# Altium footprint library PcbLib1.PcbLib: 150 footprints (part 6 of 10)
Each footprint in its own frame and in the unit in brackets; x right, y up, seen from the top. Pads: shape width x height; smd on the part's side, far side on the other; paste and mask are expansions set on the pad; w line width, h text height; cw(c..) or ccw(c..) is an arc to the next point about the centre after c.
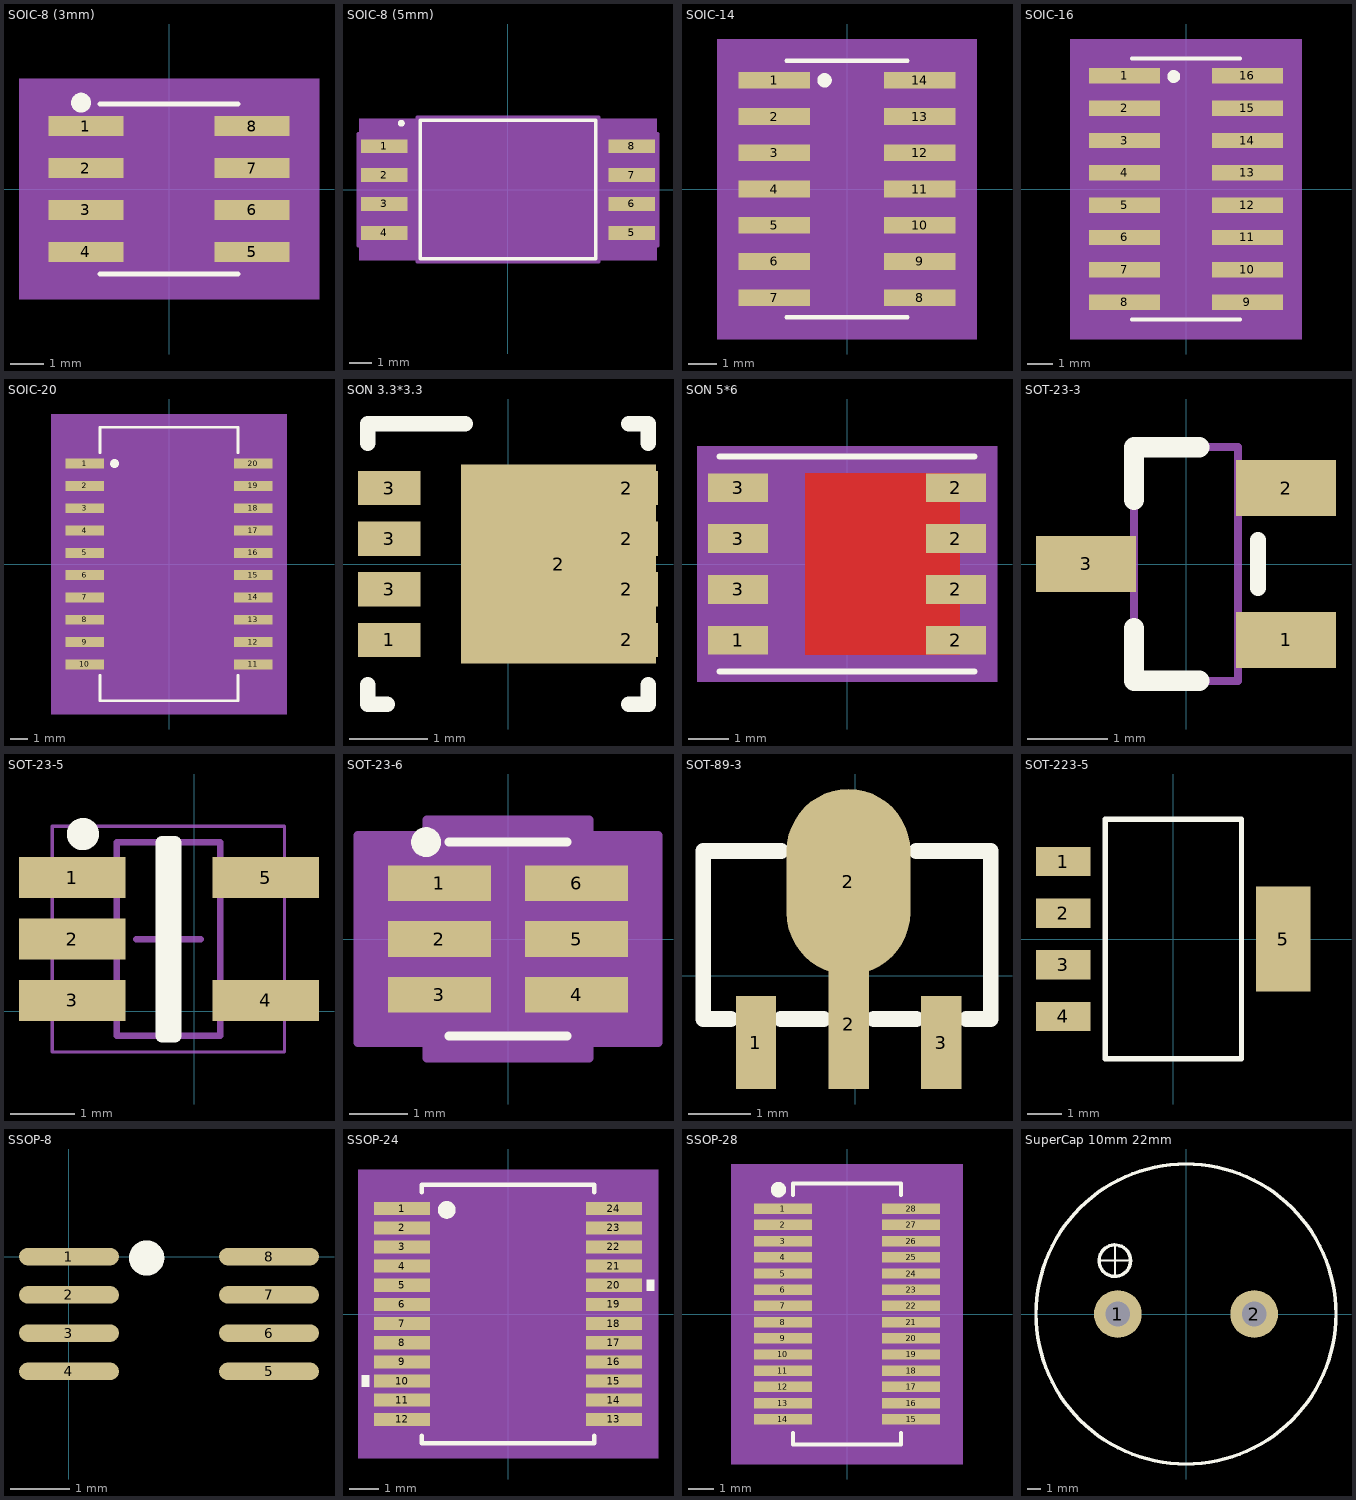
[diagram p5: the footprints below, top view; thin cyan lines are the x and y axes]

## SOIC-8 (3mm) [mm]
pads (8):
  rect 2.27x0.608 smd paste+0 mask+0: 1(-2.514,1.905) 2(-2.514,0.635) 3(-2.514,-0.635) 4(-2.514,-1.905) 5(2.514,-1.905) 6(2.514,-0.635) 7(2.514,0.635) 8(2.514,1.905)
Top Overlay:
  lines w0.152: -2.083,-2.578 2.083,-2.578 ; -2.083,2.578 2.083,2.578
  lines w0.3: -2.663,2.764 ccw(c-2.661,2.614) -2.66,2.764
Mechanical 5:
  region: 4.538,-3.34 -4.538,-3.34 -4.538,3.34 4.538,3.34
Mechanical 13:
  lines w0: -0.305,2.451 ccw(c0,2.451) 0.305,2.451
  lines w0.025: -3.099,-2.159 -3.099,-1.651 -1.956,-1.651 -1.956,-2.159 -3.099,-2.159 ; -3.099,-0.889 -3.099,-0.381 -1.956,-0.381 -1.956,-0.889 -3.099,-0.889 ; -3.099,0.381 -3.099,0.889 -1.956,0.889 -1.956,0.381 -3.099,0.381 ; -3.099,1.651 -3.099,2.159 -1.956,2.159 -1.956,1.651 -3.099,1.651 ; -1.956,-2.451 1.956,-2.451 1.956,2.451 -1.956,2.451 -1.956,-2.451 ; 1.956,-2.159 1.956,-1.651 3.099,-1.651 3.099,-2.159 1.956,-2.159 ; 1.956,-0.889 1.956,-0.381 3.099,-0.381 3.099,-0.889 1.956,-0.889 ; 1.956,0.381 1.956,0.889 3.099,0.889 3.099,0.381 1.956,0.381 ; 1.956,1.651 1.956,2.159 3.099,2.159 3.099,1.651 1.956,1.651
  text "*" at -1.892,1.105 h1.27
Mechanical 15:
  region: -2.464,-2.717 -4.157,-2.717 -4.157,2.717 -2.464,2.717 -2.464,2.959 2.464,2.959 2.464,2.717 4.157,2.717 4.157,-2.717 2.464,-2.717 2.464,-2.959 -2.464,-2.959
  lines w0.152: -4.157,-2.717 -4.157,2.717 -2.464,2.717 -2.464,2.959 2.464,2.959 2.464,2.717 4.157,2.717 4.157,-2.717 2.464,-2.717 2.464,-2.959 -2.464,-2.959 -2.464,-2.717 -4.157,-2.717
3D body: height 0.25, standoff 0, extent 0,0 0.254,0.254
3D body "D0008B_N-L.step": height 1.76, standoff 0, extent -3.099,-2.451 3.099,2.451

## SOIC-8 (5mm) [mil]
pads (8):
  rect 80x24 smd paste+0 mask+3: 1(-214.57,75) 2(-214.57,25) 3(-214.57,-25) 4(-214.57,-75) 5(214.57,-75) 6(214.57,-25) 7(214.57,25) 8(214.57,75)
Top Overlay:
  circle w6: c-185,115 r3
  lines w6: -152.5,-120 152.5,-120 152.5,120 -152.5,120 -152.5,-120
Mechanical 5:
  region: 257.57,-122.5 -257.57,-122.5 -257.57,122.5 257.57,122.5
Mechanical 13:
  circle w0: c-137.5,75 r3
  lines w0: -12,115 ccw(c0,115) 12,115
  lines w1: -147.5,-115 147.5,-115 147.5,115 -147.5,115 -147.5,-115
Mechanical 15:
  region: -157.5,-97 -260.07,-97 -260.07,97 -157.5,97 -157.5,125 157.5,125 157.5,97 260.07,97 260.07,-97 157.5,-97 157.5,-125 -157.5,-125
  lines w6: -260.07,-97 -260.07,97 -157.5,97 -157.5,125 157.5,125 157.5,97 260.07,97 260.07,-97 157.5,-97 157.5,-125 -157.5,-125 -157.5,-97 -260.07,-97
3D body: height 10, standoff 0, extent 0,0 10,10
3D body "DWV_8.step": height 110.12, standoff 0, extent -236.29,-115 236.3,115

## SOIC-14 [mil]
pads (14):
  rect 98.43x23 smd paste+0 mask+0: 1(-100.5,150) 2(-100.5,100) 3(-100.5,50) 4(-100.5,0) 5(-100.5,-50) 6(-100.5,-100) 7(-100.5,-150) 8(100.5,-150) 9(100.5,-100) 10(100.5,-50) 11(100.5,0) 12(100.5,50) 13(100.5,100) 14(100.5,150)
Top Overlay:
  circle w10: c-31,150 r5
  lines w6: -83.5,-177 83.5,-177 ; -83.5,177 83.5,177
Mechanical 5:
  region: 179,-207 -179,-207 -179,207 179,207
Mechanical 13:
  lines w0: -12,172 ccw(c0,172) 12,172
  lines w1: -122,-159.5 -78.5,-159.5 -78.5,-140.5 -122,-140.5 -122,-159.5 ; -122,-109.5 -78.5,-109.5 -78.5,-90.5 -122,-90.5 -122,-109.5 ; -122,-59.5 -78.5,-59.5 -78.5,-40.5 -122,-40.5 -122,-59.5 ; -122,-9.5 -78.5,-9.5 -78.5,9.5 -122,9.5 -122,-9.5 ; -122,40.5 -78.5,40.5 -78.5,59.5 -122,59.5 -122,40.5 ; -122,90.5 -78.5,90.5 -78.5,109.5 -122,109.5 -122,90.5 ; -122,140.5 -78.5,140.5 -78.5,159.5 -122,159.5 -122,140.5 ; -78.5,-172 -78.5,172 78.5,172 78.5,-172 -78.5,-172 ; 78.5,-159.5 122,-159.5 122,-140.5 78.5,-140.5 78.5,-159.5 ; 78.5,-109.5 122,-109.5 122,-90.5 78.5,-90.5 78.5,-109.5 ; 78.5,-59.5 122,-59.5 122,-40.5 78.5,-40.5 78.5,-59.5 ; 78.5,-9.5 122,-9.5 122,9.5 78.5,9.5 78.5,-9.5 ; 78.5,40.5 122,40.5 122,59.5 78.5,59.5 78.5,40.5 ; 78.5,90.5 122,90.5 122,109.5 78.5,109.5 78.5,90.5 ; 78.5,140.5 122,140.5 122,159.5 78.5,159.5 78.5,140.5
  text "*" at -76,119 h50
Mechanical 15:
  region: -98.5,-181.5 -164,-181.5 -164,181.5 -98.5,181.5 -98.5,192 98.5,192 98.5,181.5 164,181.5 164,-181.5 98.5,-181.5 98.5,-192 -98.5,-192
  lines w6: -164,-181.5 -98.5,-181.5 -98.5,-192 98.5,-192 98.5,-181.5 164,-181.5 164,181.5 98.5,181.5 98.5,192 -98.5,192 -98.5,181.5 -164,181.5 -164,-181.5
3D body: height 10, standoff 0, extent 0,0 10,10
3D body "SOT108-1-L.step": height 69.09, standoff 0, extent -126.01,-172.01 118.01,172

## SOIC-16 [mm]
pads (16):
  rect 2.8x0.608 smd paste+0 mask+0: 1(-2.412,4.445) 2(-2.412,3.175) 3(-2.412,1.905) 4(-2.412,0.635) 5(-2.412,-0.635) 6(-2.412,-1.905) 7(-2.412,-3.175) 8(-2.412,-4.445) 9(2.412,-4.445) 10(2.412,-3.175) 11(2.412,-1.905) 12(2.412,-0.635) 13(2.412,0.635) 14(2.412,1.905) 15(2.412,3.175) 16(2.412,4.445)
Top Overlay:
  circle w0.254: c-0.483,4.42 r0.127
  lines w0.152: -2.121,-5.131 2.121,-5.131 ; -2.121,5.131 2.121,5.131
Mechanical 5:
  region: 4.538,-5.893 -4.538,-5.893 -4.538,5.893 4.538,5.893
Mechanical 13:
  lines w0: -0.305,5.004 ccw(c0,5.004) 0.305,5.004
  lines w0.025: -3.099,-4.699 -1.994,-4.699 -1.994,-4.191 -3.099,-4.191 -3.099,-4.699 ; -3.099,-3.429 -1.994,-3.429 -1.994,-2.921 -3.099,-2.921 -3.099,-3.429 ; -3.099,-2.159 -1.994,-2.159 -1.994,-1.651 -3.099,-1.651 -3.099,-2.159 ; -3.099,-0.889 -1.994,-0.889 -1.994,-0.381 -3.099,-0.381 -3.099,-0.889 ; -3.099,0.381 -1.994,0.381 -1.994,0.889 -3.099,0.889 -3.099,0.381 ; -3.099,1.651 -1.994,1.651 -1.994,2.159 -3.099,2.159 -3.099,1.651 ; -3.099,2.921 -1.994,2.921 -1.994,3.429 -3.099,3.429 -3.099,2.921 ; -3.099,4.191 -1.994,4.191 -1.994,4.699 -3.099,4.699 -3.099,4.191 ; -1.994,-5.004 -1.994,5.004 1.994,5.004 1.994,-5.004 -1.994,-5.004 ; 1.994,-4.699 3.099,-4.699 3.099,-4.191 1.994,-4.191 1.994,-4.699 ; 1.994,-3.429 3.099,-3.429 3.099,-2.921 1.994,-2.921 1.994,-3.429 ; 1.994,-2.159 3.099,-2.159 3.099,-1.651 1.994,-1.651 1.994,-2.159 ; 1.994,-0.889 3.099,-0.889 3.099,-0.381 1.994,-0.381 1.994,-0.889 ; 1.994,0.381 3.099,0.381 3.099,0.889 1.994,0.889 1.994,0.381 ; 1.994,1.651 3.099,1.651 3.099,2.159 1.994,2.159 1.994,1.651 ; 1.994,2.921 3.099,2.921 3.099,3.429 1.994,3.429 1.994,2.921 ; 1.994,4.191 3.099,4.191 3.099,4.699 1.994,4.699 1.994,4.191
  text "*" at -1.93,3.658 h1.27
Mechanical 15:
  region: -2.502,-5.257 -4.157,-5.257 -4.157,5.257 -2.502,5.257 -2.502,5.512 2.502,5.512 2.502,5.257 4.157,5.257 4.157,-5.257 2.502,-5.257 2.502,-5.512 -2.502,-5.512
  lines w0.152: -4.157,-5.257 -2.502,-5.257 -2.502,-5.512 2.502,-5.512 2.502,-5.257 4.157,-5.257 4.157,5.257 2.502,5.257 2.502,5.512 -2.502,5.512 -2.502,5.257 -4.157,5.257 -4.157,-5.257
3D body: height 0.25, standoff 0, extent 0,0 0.254,0.254
3D body "D16-M.step": height 1.76, standoff 0, extent -3.099,-5.004 3.099,5.004

## SOIC-20 [mm]
pads (20):
  rect 2.2x0.56 smd paste+0 mask+0: 1(-4.8,5.715) 2(-4.8,4.445) 3(-4.8,3.175) 4(-4.8,1.905) 5(-4.8,0.635) 6(-4.8,-0.635) 7(-4.8,-1.905) 8(-4.8,-3.175) 9(-4.8,-4.445) 10(-4.8,-5.715) 11(4.8,-5.715) 12(4.8,-4.445) 13(4.8,-3.175) 14(4.8,-1.905) 15(4.8,-0.635) 16(4.8,0.635) 17(4.8,1.905) 18(4.8,3.175) 19(4.8,4.445) 20(4.8,5.715)
Top Overlay:
  circle w0.254: c-3.099,5.715 r0.127
  lines w0.152: -3.927,-6.328 -3.927,-7.777 3.927,-7.777 3.927,-6.328 ; -3.927,6.328 -3.927,7.777 3.927,7.777 3.927,6.328
Mechanical 5:
  region: 6.694,-8.539 -6.694,-8.539 -6.694,8.539 6.694,8.539
Mechanical 13:
  lines w0: -0.305,7.65 ccw(c0,7.65) 0.305,7.65
  lines w0.025: -5.255,-5.945 -3.8,-5.945 -3.8,-5.485 -5.255,-5.485 -5.255,-5.945 ; -5.255,-4.675 -3.8,-4.675 -3.8,-4.215 -5.255,-4.215 -5.255,-4.675 ; -5.255,-3.405 -3.8,-3.405 -3.8,-2.945 -5.255,-2.945 -5.255,-3.405 ; -5.255,-2.135 -3.8,-2.135 -3.8,-1.675 -5.255,-1.675 -5.255,-2.135 ; -5.255,-0.865 -3.8,-0.865 -3.8,-0.405 -5.255,-0.405 -5.255,-0.865 ; -5.255,0.405 -3.8,0.405 -3.8,0.865 -5.255,0.865 -5.255,0.405 ; -5.255,1.675 -3.8,1.675 -3.8,2.135 -5.255,2.135 -5.255,1.675 ; -5.255,2.945 -3.8,2.945 -3.8,3.405 -5.255,3.405 -5.255,2.945 ; -5.255,4.215 -3.8,4.215 -3.8,4.675 -5.255,4.675 -5.255,4.215 ; -5.255,5.485 -3.8,5.485 -3.8,5.945 -5.255,5.945 -5.255,5.485 ; -3.8,-7.65 -3.8,7.65 3.8,7.65 3.8,-7.65 -3.8,-7.65 ; 3.8,-5.945 5.255,-5.945 5.255,-5.485 3.8,-5.485 3.8,-5.945 ; 3.8,-4.675 5.255,-4.675 5.255,-4.215 3.8,-4.215 3.8,-4.675 ; 3.8,-3.405 5.255,-3.405 5.255,-2.945 3.8,-2.945 3.8,-3.405 ; 3.8,-2.135 5.255,-2.135 5.255,-1.675 3.8,-1.675 3.8,-2.135 ; 3.8,-0.865 5.255,-0.865 5.255,-0.405 3.8,-0.405 3.8,-0.865 ; 3.8,0.405 5.255,0.405 5.255,0.865 3.8,0.865 3.8,0.405 ; 3.8,1.675 5.255,1.675 5.255,2.135 3.8,2.135 3.8,1.675 ; 3.8,2.945 5.255,2.945 5.255,3.405 3.8,3.405 3.8,2.945 ; 3.8,4.215 5.255,4.215 5.255,4.675 3.8,4.675 3.8,4.215 ; 3.8,5.485 5.255,5.485 5.255,5.945 3.8,5.945 3.8,5.485
  text "*" at -3.737,6.304 h1.27
Mechanical 15:
  region: -4.308,-6.503 -6.313,-6.503 -6.313,6.503 -4.308,6.503 -4.308,8.158 4.308,8.158 4.308,6.503 6.313,6.503 6.313,-6.503 4.308,-6.503 4.308,-8.158 -4.308,-8.158
  lines w0.152: -6.313,-6.503 -4.308,-6.503 -4.308,-8.158 4.308,-8.158 4.308,-6.503 6.313,-6.503 6.313,6.503 4.308,6.503 4.308,8.158 -4.308,8.158 -4.308,6.503 -6.313,6.503 -6.313,-6.503
3D body: height 0.25, standoff 0, extent 0,0 0.254,0.254
3D body "RI_20_1-M.step": height 2.64, standoff 0, extent -5.255,-7.65 5.255,7.65

## SON 3.3*3.3 [mm]
pads (9):
  rect 0.8x0.44 smd paste-0.05 mask-0.051: 1(-1.525,-0.975) 2(1.525,-0.975) 2(1.525,-0.325) 2(1.525,0.325) 2(1.525,0.975) 3(-1.525,-0.325) 3(-1.525,0.325) 3(-1.525,0.975)
  rect 2.5x2.55 smd paste-1.262 mask-1.257: 2(0.65,0)
Top Overlay:
  lines w0.2: -1.8,-1.55 -1.8,-1.8 -1.55,-1.8 ; -1.8,1.55 -1.8,1.8 -0.55,1.8 ; 1.55,-1.8 1.8,-1.8 1.8,-1.55 ; 1.55,1.8 1.8,1.8 1.8,1.55
Top Paste:
  region: 0.327,0.141 0.326,0.151 0.326,1.174 0.327,1.184 0.33,1.194 0.335,1.202 0.341,1.21 0.349,1.216 0.357,1.221 0.367,1.224 0.377,1.225 0.951,1.225 0.961,1.224 0.971,1.221 0.979,1.216 0.987,1.21 0.993,1.202 0.998,1.194 1.001,1.184 1.002,1.174 1.002,0.151 1.001,0.141 0.998,0.131 0.993,0.123 0.987,0.115 0.979,0.109 0.971,0.104 0.961,0.101 0.951,0.1 0.377,0.1 0.367,0.101 0.357,0.104 0.349,0.109 0.341,0.115 0.335,0.123 0.33,0.131
  region: 0.327,-1.184 0.326,-1.174 0.326,-0.151 0.327,-0.141 0.33,-0.131 0.335,-0.123 0.341,-0.115 0.349,-0.109 0.357,-0.104 0.367,-0.101 0.377,-0.1 0.951,-0.1 0.961,-0.101 0.971,-0.104 0.979,-0.109 0.987,-0.115 0.993,-0.123 0.998,-0.131 1.001,-0.141 1.002,-0.151 1.002,-1.174 1.001,-1.184 0.998,-1.194 0.993,-1.202 0.987,-1.21 0.979,-1.216 0.971,-1.221 0.961,-1.224 0.951,-1.225 0.377,-1.225 0.367,-1.224 0.357,-1.221 0.349,-1.216 0.341,-1.21 0.335,-1.202 0.33,-1.194
  region: 0.125,-0.141 0.126,-0.151 0.126,-1.174 0.125,-1.184 0.122,-1.194 0.117,-1.202 0.111,-1.21 0.103,-1.216 0.095,-1.221 0.085,-1.224 0.075,-1.225 -0.499,-1.225 -0.509,-1.224 -0.519,-1.221 -0.527,-1.216 -0.535,-1.21 -0.541,-1.202 -0.546,-1.194 -0.549,-1.184 -0.55,-1.174 -0.55,-0.151 -0.549,-0.141 -0.546,-0.131 -0.541,-0.123 -0.535,-0.115 -0.527,-0.109 -0.519,-0.104 -0.509,-0.101 -0.499,-0.1 0.075,-0.1 0.085,-0.101 0.095,-0.104 0.103,-0.109 0.111,-0.115 0.117,-0.123 0.122,-0.131
  region: 0.125,1.184 0.126,1.174 0.126,0.151 0.125,0.141 0.122,0.131 0.117,0.123 0.111,0.115 0.103,0.109 0.095,0.104 0.085,0.101 0.075,0.1 -0.499,0.1 -0.509,0.101 -0.519,0.104 -0.527,0.109 -0.535,0.115 -0.541,0.123 -0.546,0.131 -0.549,0.141 -0.55,0.151 -0.55,1.174 -0.549,1.184 -0.546,1.194 -0.541,1.202 -0.535,1.21 -0.527,1.216 -0.519,1.221 -0.509,1.224 -0.499,1.225 0.075,1.225 0.085,1.224 0.095,1.221 0.103,1.216 0.111,1.21 0.117,1.202 0.122,1.194
Top Solder:
  drawing of 5 lines, arcs and shapes, not listed
3D body "DQG0008A.stp": height 1.1, standoff 0, extent -1.523,-1.65 1.777,1.65
3D body: height 0.25, standoff 0, extent 0,0 0.254,0.254

## SON 5*6 [mm]
pads (8):
  rect 1.5x0.71 smd paste-0.673: 1(-2.712,-1.905) 2(2.712,-1.905) 2(2.712,-0.635) 2(2.712,0.635) 2(2.712,1.905) 3(-2.712,-0.635) 3(-2.712,0.635) 3(-2.712,1.905)
Top Layer:
  region: -1.042,-2.26 -1.042,2.26 2.808,2.26 2.808,-2.26
Top Overlay:
  lines w0.152: -3.177,-2.677 3.177,-2.677 ; -3.177,2.677 3.177,2.677
Top Paste:
  region: 2.708,-0.853 1.625,-0.853 1.625,-2.16 2.708,-2.16
  region: 2.708,0.653 1.625,0.653 1.625,-0.653 2.708,-0.653
  region: 2.708,2.16 1.625,2.16 1.625,0.853 2.708,0.853
  region: 1.425,-0.853 0.342,-0.853 0.342,-2.16 1.425,-2.16
  region: 1.425,0.653 0.342,0.653 0.342,-0.653 1.425,-0.653
  region: 1.425,2.16 0.342,2.16 0.342,0.853 1.425,0.853
  region: 0.142,-0.853 -0.942,-0.853 -0.942,-2.16 0.142,-2.16
  region: 0.142,0.653 -0.942,0.653 -0.942,-0.653 0.142,-0.653
  region: 0.142,2.16 -0.942,2.16 -0.942,0.853 0.142,0.853
  region: 2.708,-0.853 1.625,-0.853 1.625,-2.16 2.708,-2.16
  region: 2.708,0.653 1.625,0.653 1.625,-0.653 2.708,-0.653
  region: 2.708,2.16 1.625,2.16 1.625,0.853 2.708,0.853
  region: 1.425,-0.853 0.342,-0.853 0.342,-2.16 1.425,-2.16
  region: 1.425,0.653 0.342,0.653 0.342,-0.653 1.425,-0.653
  region: 1.425,2.16 0.342,2.16 0.342,0.853 1.425,0.853
  region: 0.142,-0.853 -0.942,-0.853 -0.942,-2.16 0.142,-2.16
  region: 0.142,0.653 -0.942,0.653 -0.942,-0.653 0.142,-0.653
  region: 0.142,2.16 -0.942,2.16 -0.942,0.853 0.142,0.853
  region: 3.297,2.159 2.127,2.159 2.127,1.651 3.297,1.651
  region: 3.297,0.889 2.127,0.889 2.127,0.381 3.297,0.381
  region: 3.297,-0.381 2.127,-0.381 2.127,-0.889 3.297,-0.889
  region: 3.297,-1.651 2.127,-1.651 2.127,-2.159 3.297,-2.159
  region: -2.127,-1.651 -3.297,-1.651 -3.297,-2.159 -2.127,-2.159
  region: -2.127,-0.381 -3.297,-0.381 -3.297,-0.889 -2.127,-0.889
  region: -2.127,0.889 -3.297,0.889 -3.297,0.381 -2.127,0.381
  region: -2.127,2.159 -3.297,2.159 -3.297,1.651 -2.127,1.651
  region: 2.708,-0.853 1.625,-0.853 1.625,-2.16 2.708,-2.16
  region: 2.708,0.653 1.625,0.653 1.625,-0.653 2.708,-0.653
  region: 2.708,2.16 1.625,2.16 1.625,0.853 2.708,0.853
  region: 1.425,-0.853 0.342,-0.853 0.342,-2.16 1.425,-2.16
  region: 1.425,0.653 0.342,0.653 0.342,-0.653 1.425,-0.653
  region: 1.425,2.16 0.342,2.16 0.342,0.853 1.425,0.853
  region: 0.142,-0.853 -0.942,-0.853 -0.942,-2.16 0.142,-2.16
  region: 0.142,0.653 -0.942,0.653 -0.942,-0.653 0.142,-0.653
  region: 0.142,2.16 -0.942,2.16 -0.942,0.853 0.142,0.853
Top Solder:
  region: -1.042,-2.26 -1.042,2.26 2.808,2.26 2.808,-2.26
  region: 3.398,2.26 2.026,2.26 2.026,1.55 3.398,1.55
  region: 3.398,0.99 2.026,0.99 2.026,0.28 3.398,0.28
  region: 3.398,-0.28 2.026,-0.28 2.026,-0.99 3.398,-0.99
  region: 3.398,-1.55 2.026,-1.55 2.026,-2.26 3.398,-2.26
  region: -2.026,-1.55 -3.398,-1.55 -3.398,-2.26 -2.026,-2.26
  region: -2.026,-0.28 -3.398,-0.28 -3.398,-0.99 -2.026,-0.99
  region: -2.026,0.99 -3.398,0.99 -3.398,0.28 -2.026,0.28
  region: -2.026,2.26 -3.398,2.26 -3.398,1.55 -2.026,1.55
Mechanical 5:
  region: 3.736,-2.931 -3.736,-2.931 -3.736,2.931 3.736,2.931
Mechanical 13:
  circle w0: c-1.983,1.905 r0.076
  lines w0: -0.305,2.55 ccw(c0,2.55) 0.305,2.55
  lines w0.025: -3.05,-2.55 -3.05,2.55 3.05,2.55 3.05,-2.55 -3.05,-2.55
Mechanical 15:
  region: -3.304,-2.591 -3.609,-2.591 -3.609,2.591 -3.304,2.591 -3.304,2.804 3.304,2.804 3.304,2.591 3.609,2.591 3.609,-2.591 3.304,-2.591 3.304,-2.804 -3.304,-2.804
  lines w0.152: -3.609,-2.591 -3.304,-2.591 -3.304,-2.804 3.304,-2.804 3.304,-2.591 3.609,-2.591 3.609,2.591 3.304,2.591 3.304,2.804 -3.304,2.804 -3.304,2.591 -3.609,2.591 -3.609,-2.591
3D body "DQJ0008A.stp": height 1.15, standoff 0, extent -3.175,-2.323 3.085,2.577
3D body: height 0.25, standoff 0, extent 0,0 0.254,0.254

## SOT-23-3 [mm]
pads (3):
  rect 1.25x0.7 smd: 1(1.25,-0.95) 2(1.25,0.95) 3(-1.25,0)
Top Overlay:
  lines w0.2: 0.9,-0.3 0.9,0.3
  lines w0.254: -0.65,-0.8 -0.65,-1.46 0.165,-1.46 ; 0.165,1.46 -0.65,1.46 ; -0.65,0.8 -0.65,1.46 ; -0.65,0.8 -0.65,1.46 ; -0.65,0.8 -0.65,1.46
Mechanical 13:
  lines w0.1: -0.65,-1.46 -0.65,1.46 ; -0.65,-1.46 0.65,-1.46 ; -0.65,-1.46 0.65,-1.46 ; -0.65,-1.46 -0.65,1.46 ; -0.65,-1.46 0.65,-1.46 ; -0.65,-1.46 -0.65,1.46 ; -0.65,1.46 0.65,1.46 ; -0.65,1.46 0.65,1.46 ; -0.65,1.46 0.65,1.46 ; 0.65,-1.46 0.65,1.46 ; 0.65,-1.46 0.65,1.46 ; 0.65,-1.46 0.65,1.46
3D body "SOT-23.step": height 1.3, standoff 0, extent -1.5,-1.5 1.5,1.5

## SOT-23-5 [mil]
pads (5):
  rect 65x25 smd: 1(-74.5,81.5) 2(-74.5,44) 3(-74.5,6.5) 4(43.5,6.5) 5(43.5,81.5)
Top Overlay:
  circle w9.84: c-68,108 r4.92
  lines w7.87: -19.79,-15.15 -19.79,102.96 -11.92,102.96 -11.92,-15.15 -19.79,-15.15
Mechanical 13:
  lines w3.94: -47.35,-15.15 -47.35,102.96 15.64,102.96 15.64,-15.15 -47.35,-15.15
Mechanical 15:
  lines w1.97: -86.72,-25 55.01,-25 55.01,112.8 -86.72,112.8 -86.72,-25
  lines w3.94: -35.54,43.9 3.83,43.9 ; -15.85,24.22 -15.85,63.59
3D body "User Library-SOT23-5-3.STEP": height 57.17, standoff 0.48, extent -79.48,-17.52 46.5,104.52

## SOT-23-6 [mm]
pads (6):
  rect 1.762x0.608 smd paste+0 mask+0: 1(-1.168,0.95) 2(-1.168,0) 3(-1.168,-0.95) 4(1.168,-0.95) 5(1.168,0) 6(1.168,0.95)
Top Overlay:
  circle w0.254: c-1.397,1.651 r0.127
  lines w0.152: -1.003,-1.651 1.003,-1.651 ; -1.003,1.651 1.003,1.651
Mechanical 13:
  lines w0: -0.305,1.524 ccw(c0,1.524) 0.305,1.524
  lines w0.025: -1.499,-1.204 -0.876,-1.204 -0.876,-0.696 -1.499,-0.696 -1.499,-1.204 ; -1.499,-0.254 -0.876,-0.254 -0.876,0.254 -1.499,0.254 -1.499,-0.254 ; -1.499,0.696 -0.876,0.696 -0.876,1.204 -1.499,1.204 -1.499,0.696 ; -0.876,-1.524 -0.876,1.524 0.876,1.524 0.876,-1.524 -0.876,-1.524 ; 0.876,-1.204 1.499,-1.204 1.499,-0.696 0.876,-0.696 0.876,-1.204 ; 0.876,-0.254 1.499,-0.254 1.499,0.254 0.876,0.254 0.876,-0.254 ; 0.876,0.696 1.499,0.696 1.499,1.204 0.876,1.204 0.876,0.696
  text "*" at -0.813,0.178 h1.27
Mechanical 15:
  region: -1.384,-1.762 -2.557,-1.762 -2.557,1.762 -1.384,1.762 -1.384,2.032 1.384,2.032 1.384,1.762 2.557,1.762 2.557,-1.762 1.384,-1.762 1.384,-2.032 -1.384,-2.032
  lines w0.152: -2.557,-1.762 -1.384,-1.762 -1.384,-2.032 1.384,-2.032 1.384,-1.762 2.557,-1.762 2.557,1.762 1.384,1.762 1.384,2.032 -1.384,2.032 -1.384,1.762 -2.557,1.762 -2.557,-1.762
3D body: height 0.25, standoff 0, extent 0,0 0.254,0.254
3D body "DBV6-M.step": height 1.45, standoff 0, extent -1.499,-1.549 1.499,1.499

## SOT-89-3 [mm]
pads (4):
  rect 0.65x1.5 smd: 1(-1.606,-1.078) 3(1.392,-1.078)
  oval 2x3 smd: 2(-0.11,1.522)
  rect 0.65x2.1 smd: 2(-0.107,-0.778)
Top Overlay:
  lines w0.254: -2.012,-0.698 -2.459,-0.698 -2.459,2.02 -1.199,2.02 ; -1.199,-0.698 -0.513,-0.698 ; 0.299,-0.698 0.985,-0.698 ; 0.985,2.02 2.192,2.02 2.192,-0.698 1.798,-0.698
Mechanical 15:
  lines w0.003: -0.962,0.597 -0.911,0.647

## SOT-223-5 [mil]
pads (5):
  rect 62.56x33.36 smd paste+0 mask+0: 1(-126,88.58) 2(-126,29.53) 3(-126,-29.53) 4(-126,-88.58)
  rect 62.56x120.43 smd paste+0 mask+0: 5(126,0)
Top Overlay:
  lines w6: -78,-137 -78,137 78,137 78,-137 -78,-137
3D body "User Library-User Library-SOT-223-5.STEP": height 65.04, standoff 0.08, extent -138.8,-128.95 136.79,126.96

## SSOP-8 [mm]
pads (8):
  oval 1.7x0.3 smd: 1(0,0) 2(0,-0.65) 3(0,-1.3) 4(0,-1.95) 5(3.4,-1.95) 6(3.4,-1.3) 7(3.4,-0.65) 8(3.4,0)
Top Overlay:
  lines w0.3: 1.318,0.127 ccw(c1.32,-0.023) 1.321,0.127
3D body "DCT0008A.stp": height 0.91, standoff 0, extent -0.283,-2.44 3.738,0.51

## SSOP-24 [mm]
pads (24):
  rect 1.9x0.441 smd paste+0 mask+0: 1(-3.594,3.575) 2(-3.594,2.925) 3(-3.594,2.275) 4(-3.594,1.625) 5(-3.594,0.975) 6(-3.594,0.325) 7(-3.594,-0.325) 8(-3.594,-0.975) 9(-3.594,-1.625) 10(-3.594,-2.275) 11(-3.594,-2.925) 12(-3.594,-3.575) 13(3.594,-3.575) 14(3.594,-2.925) 15(3.594,-2.275) 16(3.594,-1.625) 17(3.594,-0.975) 18(3.594,-0.325) 19(3.594,0.325) 20(3.594,0.975) 21(3.594,1.625) 22(3.594,2.275) 23(3.594,2.925) 24(3.594,3.575)
Top Overlay:
  region: 4.706,1.165 4.96,1.165 4.96,0.784 4.706,0.784
  region: -4.706,-2.084 -4.96,-2.084 -4.96,-2.465 -4.706,-2.465
  lines w0.152: -2.921,-4.128 -2.921,-4.381 2.921,-4.381 2.921,-4.128 ; -2.921,4.128 -2.921,4.381 2.921,4.381 2.921,4.128
  lines w0.3: -2.078,3.678 ccw(c-2.077,3.528) -2.076,3.678
Mechanical 5:
  region: 5.087,-4.889 -5.087,-4.889 -5.087,4.889 5.087,4.889
Mechanical 13:
  lines w0: -0.305,4.255 ccw(c0,4.255) 0.305,4.255
  lines w0.025: -4.102,-3.765 -2.794,-3.765 -2.794,-3.384 -4.102,-3.384 -4.102,-3.765 ; -4.102,-3.115 -2.794,-3.115 -2.794,-2.734 -4.102,-2.734 -4.102,-3.115 ; -4.102,-2.465 -2.794,-2.465 -2.794,-2.084 -4.102,-2.084 -4.102,-2.465 ; -4.102,-1.815 -2.794,-1.815 -2.794,-1.434 -4.102,-1.434 -4.102,-1.815 ; -4.102,-1.165 -2.794,-1.165 -2.794,-0.784 -4.102,-0.784 -4.102,-1.165 ; -4.102,-0.515 -2.794,-0.515 -2.794,-0.134 -4.102,-0.134 -4.102,-0.515 ; -4.102,0.135 -2.794,0.135 -2.794,0.516 -4.102,0.516 -4.102,0.135 ; -4.102,0.785 -2.794,0.785 -2.794,1.166 -4.102,1.166 -4.102,0.785 ; -4.102,1.435 -2.794,1.435 -2.794,1.816 -4.102,1.816 -4.102,1.435 ; -4.102,2.085 -2.794,2.085 -2.794,2.466 -4.102,2.466 -4.102,2.085 ; -4.102,2.735 -2.794,2.735 -2.794,3.116 -4.102,3.116 -4.102,2.735 ; -4.102,3.384 -2.794,3.384 -2.794,3.765 -4.102,3.765 -4.102,3.384 ; -2.794,-4.255 -2.794,4.255 2.794,4.255 2.794,-4.255 -2.794,-4.255 ; 2.794,-3.765 4.102,-3.765 4.102,-3.384 2.794,-3.384 2.794,-3.765 ; 2.794,-3.116 4.102,-3.116 4.102,-2.735 2.794,-2.735 2.794,-3.116 ; 2.794,-2.465 4.102,-2.465 4.102,-2.084 2.794,-2.084 2.794,-2.465 ; 2.794,-1.816 4.102,-1.816 4.102,-1.435 2.794,-1.435 2.794,-1.816 ; 2.794,-1.165 4.102,-1.165 4.102,-0.784 2.794,-0.784 2.794,-1.165 ; 2.794,-0.516 4.102,-0.516 4.102,-0.135 2.794,-0.135 2.794,-0.516 ; 2.794,0.134 4.102,0.134 4.102,0.515 2.794,0.515 2.794,0.134 ; 2.794,0.784 4.102,0.784 4.102,1.165 2.794,1.165 2.794,0.784 ; 2.794,1.434 4.102,1.434 4.102,1.815 2.794,1.815 2.794,1.434 ; 2.794,2.084 4.102,2.084 4.102,2.465 2.794,2.465 2.794,2.084 ; 2.794,2.734 4.102,2.734 4.102,3.115 2.794,3.115 2.794,2.734 ; 2.794,3.384 4.102,3.384 4.102,3.765 2.794,3.765 2.794,3.384
  text "*" at -2.73,2.908 h1.27
Mechanical 15:
  region: -3.048,-4.049 -4.706,-4.049 -4.706,4.049 -3.048,4.049 -3.048,4.508 3.048,4.508 3.048,4.049 4.706,4.049 4.706,-4.049 3.048,-4.049 3.048,-4.508 -3.048,-4.508
  lines w0.152: -4.706,-4.049 -3.048,-4.049 -3.048,-4.508 3.048,-4.508 3.048,-4.049 4.706,-4.049 4.706,4.049 3.048,4.049 3.048,4.508 -3.048,4.508 -3.048,4.049 -4.706,4.049 -4.706,-4.049
3D body: height 0.25, standoff 0, extent 0,0 0.254,0.254
3D body "CIR-SSOP-24.step": height 2.14, standoff 0, extent -4.102,-4.254 4.102,4.254

## SSOP-28 [mm]
pads (28):
  rect 2.27x0.405 smd paste+0 mask+0: 1(-2.514,4.127) 2(-2.514,3.492) 3(-2.514,2.857) 4(-2.514,2.222) 5(-2.514,1.587) 6(-2.514,0.953) 7(-2.514,0.318) 8(-2.514,-0.318) 9(-2.514,-0.953) 10(-2.514,-1.587) 11(-2.514,-2.222) 12(-2.514,-2.857) 13(-2.514,-3.492) 14(-2.514,-4.127) 15(2.514,-4.127) 16(2.514,-3.492) 17(2.514,-2.857) 18(2.514,-2.222) 19(2.514,-1.587) 20(2.514,-0.953) 21(2.514,-0.318) 22(2.514,0.318) 23(2.514,0.953) 24(2.514,1.587) 25(2.514,2.222) 26(2.514,2.857) 27(2.514,3.492) 28(2.514,4.127)
Top Overlay:
  lines w0.152: -2.121,-4.663 -2.121,-5.118 2.121,-5.118 2.121,-4.663 ; -2.121,4.663 -2.121,5.118 2.121,5.118 2.121,4.663
  lines w0.3: -2.688,5.024 ccw(c-2.687,4.874) -2.685,5.024
Mechanical 5:
  region: 4.538,-5.88 -4.538,-5.88 -4.538,5.88 4.538,5.88
Mechanical 13:
  lines w0: -0.305,4.991 ccw(c0,4.991) 0.305,4.991
  lines w0.025: -3.099,-4.28 -1.994,-4.28 -1.994,-3.975 -3.099,-3.975 -3.099,-4.28 ; -3.099,-3.645 -1.994,-3.645 -1.994,-3.34 -3.099,-3.34 -3.099,-3.645 ; -3.099,-3.01 -1.994,-3.01 -1.994,-2.705 -3.099,-2.705 -3.099,-3.01 ; -3.099,-2.375 -1.994,-2.375 -1.994,-2.07 -3.099,-2.07 -3.099,-2.375 ; -3.099,-1.74 -1.994,-1.74 -1.994,-1.435 -3.099,-1.435 -3.099,-1.74 ; -3.099,-1.105 -1.994,-1.105 -1.994,-0.8 -3.099,-0.8 -3.099,-1.105 ; -3.099,-0.47 -1.994,-0.47 -1.994,-0.165 -3.099,-0.165 -3.099,-0.47 ; -3.099,0.165 -1.994,0.165 -1.994,0.47 -3.099,0.47 -3.099,0.165 ; -3.099,0.8 -1.994,0.8 -1.994,1.105 -3.099,1.105 -3.099,0.8 ; -3.099,1.435 -1.994,1.435 -1.994,1.74 -3.099,1.74 -3.099,1.435 ; -3.099,2.07 -1.994,2.07 -1.994,2.375 -3.099,2.375 -3.099,2.07 ; -3.099,2.705 -1.994,2.705 -1.994,3.01 -3.099,3.01 -3.099,2.705 ; -3.099,3.34 -1.994,3.34 -1.994,3.645 -3.099,3.645 -3.099,3.34 ; -3.099,3.975 -1.994,3.975 -1.994,4.28 -3.099,4.28 -3.099,3.975 ; -1.994,-4.991 -1.994,4.991 1.994,4.991 1.994,-4.991 -1.994,-4.991 ; 1.994,-4.28 3.099,-4.28 3.099,-3.975 1.994,-3.975 1.994,-4.28 ; 1.994,-3.645 3.099,-3.645 3.099,-3.34 1.994,-3.34 1.994,-3.645 ; 1.994,-3.01 3.099,-3.01 3.099,-2.705 1.994,-2.705 1.994,-3.01 ; 1.994,-2.375 3.099,-2.375 3.099,-2.07 1.994,-2.07 1.994,-2.375 ; 1.994,-1.74 3.099,-1.74 3.099,-1.435 1.994,-1.435 1.994,-1.74 ; 1.994,-1.105 3.099,-1.105 3.099,-0.8 1.994,-0.8 1.994,-1.105 ; 1.994,-0.47 3.099,-0.47 3.099,-0.165 1.994,-0.165 1.994,-0.47 ; 1.994,0.165 3.099,0.165 3.099,0.47 1.994,0.47 1.994,0.165 ; 1.994,0.8 3.099,0.8 3.099,1.105 1.994,1.105 1.994,0.8 ; 1.994,1.435 3.099,1.435 3.099,1.74 1.994,1.74 1.994,1.435 ; 1.994,2.07 3.099,2.07 3.099,2.375 1.994,2.375 1.994,2.07 ; 1.994,2.705 3.099,2.705 3.099,3.01 1.994,3.01 1.994,2.705 ; 1.994,3.34 3.099,3.34 3.099,3.645 1.994,3.645 1.994,3.34 ; 1.994,3.975 3.099,3.975 3.099,4.28 1.994,4.28 1.994,3.975
  text "*" at -1.93,3.645 h1.27
Mechanical 15:
  region: -2.502,-4.838 -4.157,-4.838 -4.157,4.838 -2.502,4.838 -2.502,5.499 2.502,5.499 2.502,4.838 4.157,4.838 4.157,-4.838 2.502,-4.838 2.502,-5.499 -2.502,-5.499
  lines w0.152: -4.157,-4.838 -2.502,-4.838 -2.502,-5.499 2.502,-5.499 2.502,-4.838 4.157,-4.838 4.157,4.838 2.502,4.838 2.502,5.499 -2.502,5.499 -2.502,4.838 -4.157,4.838 -4.157,-4.838
3D body: height 0.25, standoff 0, extent 0,0 0.254,0.254
3D body "SSOP-28_GN-M.step": height 1.7, standoff 0, extent -3.099,-4.991 3.099,4.991

## SuperCap 10mm 22mm [mm]
pads (2):
  round 3.5 hole 1.8: 1(-5,0) 2(5,0)
Top Overlay:
  circle w0.254: c-5.22,3.912 r1.156
  circle w0.254: c0,0 r11
  lines w0.152: -6.274,3.912 -4.166,3.912 ; -5.22,2.857 -5.22,4.966
3D body "2.STEP": height 46, standoff -6, extent -15.531,-15.582 15.582,15.531